# Altium footprint library IC_updated.PcbLib: 64 footprints (part 1 of 4)
Each footprint in its own frame and in the unit in brackets; x right, y up, seen from the top. Pads: shape width x height; smd on the part's side, far side on the other; paste and mask are expansions set on the pad; w line width, h text height; cw(c..) or ccw(c..) is an arc to the next point about the centre after c.
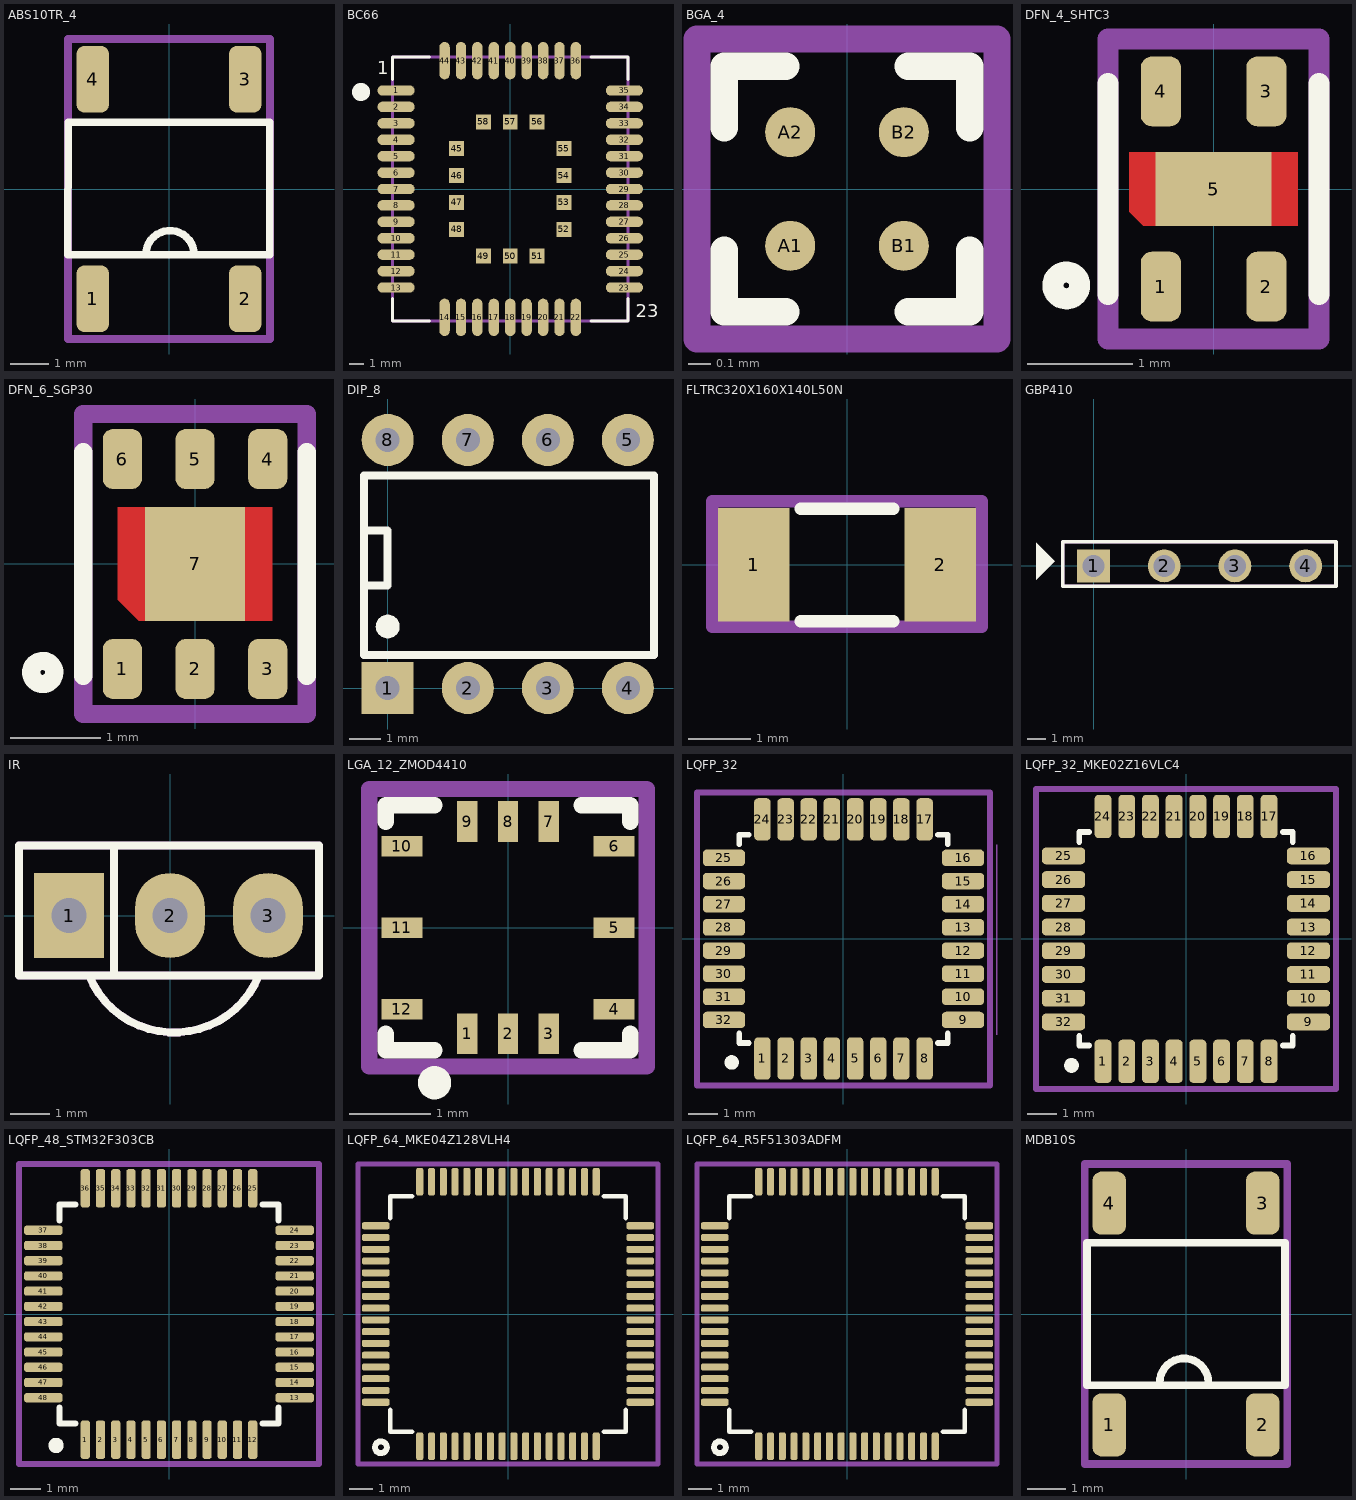
[diagram p0: the footprints below, top view; thin cyan lines are the x and y axes]

## ABS10TR_4 [mm] "Small Outline IC (SOIC), 4.00 mm pitch; 4 pin, 5.05 mm L X 4.40 mm W X 1.50 mm H body"
height 1.5
pads (4):
  rrect49% 0.85x1.75 smd: 1(-2,-2.88) 2(2,-2.88) 3(2,2.88) 4(-2,2.88)
Top Overlay:
  lines w0.2: -0.61,-1.727 cw(c0.025,-1.727) 0.66,-1.727 ; -2.655,-1.727 -2.647,1.756 2.642,1.756 2.642,-1.727 -2.655,-1.727
Mechanical 13:
  lines w0.2: -2.65,-3.937 -2.65,3.937 2.65,3.937 2.65,-3.937 -2.65,-3.937
  text ".Designator" at -2.388,-0.203 h1.5
3D body "DB.STEP": height 1.5, standoff 0, extent -2.525,-3.2 2.525,3.2

## BC66 [mm]
pads (58):
  oval 2.5x0.7 smd: 1(-7.65,6.6) 2(-7.65,5.5) 3(-7.65,4.4) 4(-7.65,3.3) 5(-7.65,2.2) 6(-7.65,1.1) 7(-7.65,0) 8(-7.65,-1.1) 9(-7.65,-2.2) 10(-7.65,-3.3) 11(-7.65,-4.4) 12(-7.65,-5.5) 13(-7.65,-6.6) 23(7.65,-6.6) 24(7.65,-5.5) 25(7.65,-4.4) 26(7.65,-3.3) 27(7.65,-2.2) 28(7.65,-1.1) 29(7.65,0) 30(7.65,1.1) 31(7.65,2.2) 32(7.65,3.3) 33(7.65,4.4) 34(7.65,5.5) 35(7.65,6.6)
  oval 0.7x2.5 smd: 14(-4.4,-8.6) 15(-3.3,-8.6) 16(-2.2,-8.6) 17(-1.1,-8.6) 18(0,-8.6) 19(1.1,-8.6) 20(2.2,-8.6) 21(3.3,-8.6) 22(4.4,-8.6) 36(4.4,8.6) 37(3.3,8.6) 38(2.2,8.6) 39(1.1,8.6) 40(0,8.6) 41(-1.1,8.6) 42(-2.2,8.6) 43(-3.3,8.6) 44(-4.4,8.6)
  rect 1x1 smd: 45(-3.6,2.7) 46(-3.6,0.9) 47(-3.6,-0.9) 48(-3.6,-2.7) 49(-1.8,-4.5) 50(0,-4.5) 51(1.8,-4.5) 52(3.6,-2.7) 53(3.6,-0.9) 54(3.6,0.9) 55(3.6,2.7) 56(1.8,4.5) 57(0,4.5) 58(-1.8,4.5)
Top Overlay:
  circle w0.8: c-10,6.5 r0.2
  lines w0.2: -7.9,-8.85 -5.4,-8.85 ; -7.9,-8.85 -7.9,-7.35 ; -7.9,7.35 -7.9,8.85 -5.4,8.85 ; 5.4,-8.85 7.9,-8.85 ; 5.4,8.85 7.9,8.85 7.9,7.35 ; 7.9,-8.85 7.9,-7.35
  text "1" at -8.9,7.4 h1.5
  text "23" at 8.4,-8.9 h1.5
Mechanical 13:
  lines w0.2: -7.9,-8.85 7.9,-8.85 7.9,8.85 -7.9,8.85 -7.9,-8.85
  text ".Designator" at -2.1,-0.8 h1.5
3D body: height 2, standoff 0, extent -7.874,-8.839 7.874,8.839

## BGA_4 [mm] "Ball Grid Array (BGA), 0.50 mm pitch, square; 4 pin, 0.888 mm L X 0.888 mm W X 0.50 mm H body"
height 0.5
pads (4):
  round 0.22 smd: A1(-0.25,-0.25) A2(-0.25,0.25) B1(0.25,-0.25) B2(0.25,0.25)
Top Overlay:
  lines w0.12: -0.54,-0.27 -0.54,-0.54 -0.27,-0.54 ; -0.54,0.27 -0.54,0.54 -0.27,0.54 ; 0.27,-0.54 0.54,-0.54 0.54,-0.27 ; 0.27,0.54 0.54,0.54 0.54,0.27
Mechanical 13:
  lines w0.12: -0.66,-0.66 0.66,-0.66 0.66,0.66 -0.66,0.66 -0.66,-0.66
  text ".Designator" at -0.737,-0.203 h1
3D body "BGA4CP50_2X2_88X88X50B22.STEP": height 0.5, standoff 0, extent -0.444,-0.444 0.444,0.444

## DFN_4_SHTC3 [mm] "Small Outline No-Lead (SON with Tab), 1.00 mm pitch; 4 pin, 2.00 mm L X 2.00 mm W X 0.75 mm H body"
height 0.75
pads (5):
  rrect53% 0.38x0.66 smd: 1(-0.5,-0.925) 2(0.5,-0.925) 3(0.5,0.925) 4(-0.5,0.925)
  rect 1.1x0.7 smd paste-1.1 mask-1.1: 5(0,0)
Top Layer:
  region: 0.8,-0.35 -0.666,-0.35 -0.8,-0.216 -0.8,0.35 0.8,0.35
Top Overlay:
  lines w0.2: -1.271,-0.897 ccw(c-1.397,-0.914) -1.27,-0.914 ; -1,-1 -1,1 ; 1,-1 1,1
Top Paste:
  region: 0.8,-0.35 -0.55,-0.35 -0.8,-0.1 -0.8,0.35 0.8,0.35
Top Solder:
  region: 0.8,-0.35 -0.55,-0.35 -0.8,-0.1 -0.8,0.35 0.8,0.35
Mechanical 13:
  lines w0.2: -1,-1.422 -1,1.422 1,1.422 1,-1.422 -1,-1.422
  text ".Designator" at -0.813,-0.254 h1
3D body "SON5P100_200X200X75L35X35T160X70.STEP": height 0.75, standoff 0, extent -1,-1.05 1,1.05

## DFN_6_SGP30 [mm] "Small Outline No-Lead (SON with Tab), 0.80 mm pitch; 6 pin, 2.45 mm L X 2.45 mm W X 0.90 mm H body"
height 0.9
pads (7):
  rrect51% 0.43x0.66 smd: 1(-0.8,-1.155) 2(0,-1.155) 3(0.8,-1.155) 4(0.8,1.155) 5(0,1.155) 6(-0.8,1.155)
  rect 1.1x1.25 smd paste-1.25 mask-1.25: 7(0,0)
Top Layer:
  region: 0.85,-0.625 -0.62,-0.625 -0.85,-0.395 -0.85,0.625 0.85,0.625
Top Overlay:
  lines w0.2: -1.551,-1.177 ccw(c-1.676,-1.194) -1.549,-1.194 ; -1.23,-1.23 -1.23,1.23 ; 1.23,-1.23 1.23,1.23
Top Paste:
  region: -0.09,-0.431 -0.744,-0.431 -0.744,0.44 -0.09,0.44
  region: 0.76,-0.44 0.09,-0.44 0.09,0.44 0.76,0.44
Top Solder:
  region: 0.85,-0.625 -0.55,-0.625 -0.85,-0.325 -0.85,0.625 0.85,0.625
Mechanical 13:
  lines w0.2: -1.23,-1.651 1.23,-1.651 1.23,1.651 -1.23,1.651 -1.23,-1.651
  text ".Designator" at -1.041,-0.356 h1
3D body "SON7P80_245X245X90L35X40T170X125.STEP": height 0.9, standoff 0, extent -1.225,-1.275 1.225,1.275

## DIP_8 [mm] "DIP, 7.62 mm lead span, 2.54 mm pitch; 8 pin, 10.92 mm L X 6.60 mm W X 3.32 mm H body"
height 3.32
pads (9):
  rect 1.65x1.65 hole 0.762 mask+0.102: 1(0,0)
  round 1.65 hole 0.762 mask+0.102: 2(2.54,0) 3(5.08,0) 4(7.62,0) 5(7.62,7.87) 6(5.08,7.87) 7(2.54,7.87) 8(0,7.87)
  round 0.762 on Top Overlay mask+0.102: ""(0,1.95)
Top Overlay:
  lines w0.254: -0.75,3.25 0,3.25 0,5 -0.7,5 ; -0.75,1.05 8.45,1.05 8.45,6.75 -0.75,6.75 -0.75,1.05
Mechanical 13:
  lines w0.2: -0.762,1.067 8.458,1.041 8.433,6.756 -0.737,6.731 -0.762,1.067
  text ".Designator" at 0.813,3.861 h1.5
3D body "DIP762W45P254L1092H332Q8.STEP": height 3.32, standoff -2, extent -1.65,0.051 9.27,7.925

## FLTRC320X160X140L50N [mm]
pads (2):
  rect 1.14x1.82 smd: 1(-1.49,0) 2(1.49,0)
Top Overlay:
  lines w0.2: -0.74,-0.9 0.74,-0.9 ; -0.74,0.9 0.74,0.9
Mechanical 13:
  lines w0.127: -2.159,-0.991 -2.159,1.016 2.159,1.016 2.159,-0.991 -2.159,-0.991
  lines w0.2: -2.159,-0.991 2.159,-0.991 2.159,1.016 -2.159,1.016 -2.159,-0.991
  text ".Designator" at -1.88,-0.254 h1
3D body "FLTRC320X160X140L50.STEP": height 1.4, standoff 0, extent -1.6,-0.8 1.6,0.8

## GBP410 [mm] "SIP, 3.81 mm pitch; 4 pin, 14.70 mm L X 2.20 mm W X 12.50 mm H body"
height 12.5
pads (4):
  rect 1.77x1.77 / inner round 1.77 / far side rect 1.77x1.77 hole 1.18 paste-1.77: 1(0,0)
  round 1.77 hole 1.18 paste-1.77: 2(3.81,0) 3(7.62,0) 4(11.43,0)
Top Overlay:
  region: -3.099,-0.746 -2.099,0.254 -3.099,1.254
  lines w0.2: -1.651,-1.092 13.065,-1.092 13.065,1.3 -1.651,1.3 -1.651,-1.092
Mechanical 13:
  lines w0.2: -1.651,-1.092 -1.651,1.295 13.056,1.295 13.056,-1.092 -1.651,-1.092
  text ".Designator" at 2.007,-0.254 h1.5
3D body "SIP220W74P381L1470H1250Q4.STEP": height 12.5, standoff -2, extent -1.635,-0.9 13.065,1.3

## IR [mil]
pads (3):
  rect 70x85 hole 35: 1(-101,0)
  oval 70x85 hole 35: 2(0,0) 3(98,0)
Top Overlay:
  lines w7.87: -81,-60 ccw(c4,-25) 89,-60 ; -56,-60 -56,70 ; -151,-60 149,-60 149,70 -151,70 -151,-60
Mechanical 13:
  lines w7.87: -81,-60 ccw(c4,-25) 89,-60 ; -56,-60 -56,70 ; -151,-60 -151,70 149,70 149,-60 -151,-60
  text ".Designator" at -140,-15 h39.37
3D body "SW3dPS-TO92.STEP": height 245.04, standoff -199.79, extent -108.87,-99.53 108.87,61.03

## LGA_12_ZMOD4410 [mm]
pads (12):
  rect 0.25x0.5 smd: 1(-0.5,-1.3) 2(0,-1.3) 3(0.5,-1.3) 7(0.5,1.3) 8(0,1.3) 9(-0.5,1.3)
  rect 0.5x0.25 smd: 4(1.3,-1) 5(1.3,0) 6(1.3,1) 10(-1.3,1) 11(-1.3,0) 12(-1.3,-1)
Top Overlay:
  circle w0.254: c-0.9,-1.9 r0.076
  lines w0.2: -1.5,-1.3 -1.5,-1.5 -0.9,-1.5 ; -1.5,1.3 -1.5,1.5 -0.9,1.5 ; 0.9,-1.5 1.5,-1.5 1.5,-1.3 ; 0.9,1.5 1.5,1.5 1.5,1.3
Mechanical 13:
  lines w0.2: -1.7,-1.7 1.7,-1.7 1.7,1.7 -1.7,1.7 -1.7,-1.7
  text ".Designator" at -1.168,-0.406 h1
3D body: height 0.77, standoff 0, extent -1.5,-1.5 1.5,1.5

## LQFP_32 [mm] "Quad Flat Pack (QFP), 0.80 mm pitch; square, 8 pin X 8 pin, 7.00 mm L X 7.00 mm W X 1.60 mm H body"
height 1.6
pads (32):
  rrect49% 0.57x1.46 smd: 1(-2.8,-4.13) 2(-2,-4.13) 3(-1.2,-4.13) 4(-0.4,-4.13) 5(0.4,-4.13) 6(1.2,-4.13) 7(2,-4.13) 8(2.8,-4.13) 17(2.8,4.13) 18(2,4.13) 19(1.2,4.13) 20(0.4,4.13) 21(-0.4,4.13) 22(-1.2,4.13) 23(-2,4.13) 24(-2.8,4.13)
  rrect49% 1.46x0.57 smd: 9(4.13,-2.8) 10(4.13,-2) 11(4.13,-1.2) 12(4.13,-0.4) 13(4.13,0.4) 14(4.13,1.2) 15(4.13,2) 16(4.13,2.8) 25(-4.13,2.8) 26(-4.13,2) 27(-4.13,1.2) 28(-4.13,0.4) 29(-4.13,-0.4) 30(-4.13,-1.2) 31(-4.13,-2) 32(-4.13,-2.8)
Top Overlay:
  circle w0.25: c-3.861,-4.267 r0.125
  lines w0.2: -3.6,-3.27 -3.6,-3.6 -3.27,-3.6 ; -3.6,3.27 -3.6,3.6 -3.27,3.6 ; 3.27,-3.6 3.6,-3.6 3.6,-3.27 ; 3.27,3.6 3.6,3.6 3.6,3.27
Mechanical 13:
  lines w0.2: -5.06,-5.06 5.06,-5.06 5.06,5.055 -5.06,5.055 -5.06,-5.06
  text ".Designator" at -3.023,-0.178 h1.5
Mechanical 15:
  lines w0.05: 5.303,-3.31 5.303,3.26
3D body "QFP32P80_900X900X160L60X37.STEP": height 1.6, standoff 0, extent -4.5,-4.5 4.5,4.5

## LQFP_32_MKE02Z16VLC4 [mm] "Quad Flat Pack (QFP), 0.80 mm pitch; square, 8 pin X 8 pin, 7.00 mm L X 7.00 mm W X 1.60 mm H body"
height 1.6
pads (32):
  rrect49% 0.57x1.46 smd: 1(-2.8,-4.13) 2(-2,-4.13) 3(-1.2,-4.13) 4(-0.4,-4.13) 5(0.4,-4.13) 6(1.2,-4.13) 7(2,-4.13) 8(2.8,-4.13) 17(2.8,4.13) 18(2,4.13) 19(1.2,4.13) 20(0.4,4.13) 21(-0.4,4.13) 22(-1.2,4.13) 23(-2,4.13) 24(-2.8,4.13)
  rrect49% 1.46x0.57 smd: 9(4.13,-2.8) 10(4.13,-2) 11(4.13,-1.2) 12(4.13,-0.4) 13(4.13,0.4) 14(4.13,1.2) 15(4.13,2) 16(4.13,2.8) 25(-4.13,2.8) 26(-4.13,2) 27(-4.13,1.2) 28(-4.13,0.4) 29(-4.13,-0.4) 30(-4.13,-1.2) 31(-4.13,-2) 32(-4.13,-2.8)
Top Overlay:
  circle w0.25: c-3.861,-4.267 r0.125
  lines w0.2: -3.6,-3.27 -3.6,-3.6 -3.27,-3.6 ; -3.6,3.27 -3.6,3.6 -3.27,3.6 ; 3.27,-3.6 3.6,-3.6 3.6,-3.27 ; 3.27,3.6 3.6,3.6 3.6,3.27
Mechanical 13:
  lines w0.2: -5.06,-5.06 -5.06,5.055 5.06,5.055 5.06,-5.06 -5.06,-5.06
  text ".Designator" at -3.023,-0.178 h1.5
3D body "QFP32P80_900X900X160L60X37.STEP": height 1.6, standoff 0, extent -4.5,-4.5 4.5,4.5

## LQFP_48_STM32F303CB [mm] "Quad Flat Pack (QFP), 0.50 mm pitch; square, 12 pin X 12 pin, 7.00 mm L X 7.00 mm W X 1.60 mm H body"
height 1.6
pads (48):
  rrect53% 0.3x1.26 smd: 1(-2.75,-4.13) 2(-2.25,-4.13) 3(-1.75,-4.13) 4(-1.25,-4.13) 5(-0.75,-4.13) 6(-0.25,-4.13) 7(0.25,-4.13) 8(0.75,-4.13) 9(1.25,-4.13) 10(1.75,-4.13) 11(2.25,-4.13) 12(2.75,-4.13) 25(2.75,4.13) 26(2.25,4.13) 27(1.75,4.13) 28(1.25,4.13) 29(0.75,4.13) 30(0.25,4.13) 31(-0.25,4.13) 32(-0.75,4.13) 33(-1.25,4.13) 34(-1.75,4.13) 35(-2.25,4.13) 36(-2.75,4.13)
  rrect53% 1.26x0.3 smd: 13(4.13,-2.75) 14(4.13,-2.25) 15(4.13,-1.75) 16(4.13,-1.25) 17(4.13,-0.75) 18(4.13,-0.25) 19(4.13,0.25) 20(4.13,0.75) 21(4.13,1.25) 22(4.13,1.75) 23(4.13,2.25) 24(4.13,2.75) 37(-4.13,2.75) 38(-4.13,2.25) 39(-4.13,1.75) 40(-4.13,1.25) 41(-4.13,0.75) 42(-4.13,0.25) 43(-4.13,-0.25) 44(-4.13,-0.75) 45(-4.13,-1.25) 46(-4.13,-1.75) 47(-4.13,-2.25) 48(-4.13,-2.75)
Top Overlay:
  circle w0.25: c-3.708,-4.318 r0.125
  lines w0.2: -3.6,-3.08 -3.6,-3.6 -3.08,-3.6 ; -3.6,3.08 -3.6,3.6 -3.08,3.6 ; 3.08,-3.6 3.6,-3.6 3.6,-3.08 ; 3.08,3.6 3.6,3.6 3.6,3.08
Mechanical 13:
  lines w0.2: -4.928,-4.928 -4.928,4.928 4.928,4.928 4.928,-4.928 -4.928,-4.928
  text ".Designator" at -3.124,-0.152 h1.5
3D body "QFP48P50_900X900X160L60X22.STEP": height 1.6, standoff 0, extent -4.5,-4.5 4.5,4.5

## LQFP_64_MKE04Z128VLH4 [mm] "Quad Flat Pack (QFP), 0.50 mm pitch; square, 16 pin X 16 pin, 10.00 mm L X 10.00 mm W X 1.45 mm H body"
height 1.45
pads (64):
  rrect53% 0.3x1.17 smd: 1(-3.75,-5.62) 2(-3.25,-5.62) 3(-2.75,-5.62) 4(-2.25,-5.62) 5(-1.75,-5.62) 6(-1.25,-5.62) 7(-0.75,-5.62) 8(-0.25,-5.62) 9(0.25,-5.62) 10(0.75,-5.62) 11(1.25,-5.62) 12(1.75,-5.62) 13(2.25,-5.62) 14(2.75,-5.62) 15(3.25,-5.62) 16(3.75,-5.62) 33(3.75,5.62) 34(3.25,5.62) 35(2.75,5.62) 36(2.25,5.62) 37(1.75,5.62) 38(1.25,5.62) 39(0.75,5.62) 40(0.25,5.62) 41(-0.25,5.62) 42(-0.75,5.62) 43(-1.25,5.62) 44(-1.75,5.62) 45(-2.25,5.62) 46(-2.75,5.62) 47(-3.25,5.62) 48(-3.75,5.62)
  rrect53% 1.17x0.3 smd: 17(5.62,-3.75) 18(5.62,-3.25) 19(5.62,-2.75) 20(5.62,-2.25) 21(5.62,-1.75) 22(5.62,-1.25) 23(5.62,-0.75) 24(5.62,-0.25) 25(5.62,0.25) 26(5.62,0.75) 27(5.62,1.25) 28(5.62,1.75) 29(5.62,2.25) 30(5.62,2.75) 31(5.62,3.25) 32(5.62,3.75) 49(-5.62,3.75) 50(-5.62,3.25) 51(-5.62,2.75) 52(-5.62,2.25) 53(-5.62,1.75) 54(-5.62,1.25) 55(-5.62,0.75) 56(-5.62,0.25) 57(-5.62,-0.25) 58(-5.62,-0.75) 59(-5.62,-1.25) 60(-5.62,-1.75) 61(-5.62,-2.25) 62(-5.62,-2.75) 63(-5.62,-3.25) 64(-5.62,-3.75)
Top Overlay:
  circle w0.254: c-5.4,-5.664 r0.25
  lines w0.2: -5,-4.08 -5,-5 -4.08,-5 ; -5,4.08 -5,5 -4.08,5 ; 4.08,-5 5,-5 5,-4.08 ; 4.08,5 5,5 5,4.08
Mechanical 13:
  lines w0.2: -6.375,-6.375 -6.375,6.375 6.375,6.375 6.375,-6.375 -6.375,-6.375
  text ".Designator" at -4.318,0.102 h1.5
3D body "QFP64P50_1200X1200X145L60X22.STEP": height 1.45, standoff 0, extent -6,-6 6,6

## LQFP_64_R5F51303ADFM [mm] "Quad Flat Pack (QFP), 0.50 mm pitch; square, 16 pin X 16 pin, 10.00 mm L X 10.00 mm W X 1.70 mm H body"
height 1.7
pads (64):
  rrect53% 0.3x1.17 smd: 1(-3.75,-5.62) 2(-3.25,-5.62) 3(-2.75,-5.62) 4(-2.25,-5.62) 5(-1.75,-5.62) 6(-1.25,-5.62) 7(-0.75,-5.62) 8(-0.25,-5.62) 9(0.25,-5.62) 10(0.75,-5.62) 11(1.25,-5.62) 12(1.75,-5.62) 13(2.25,-5.62) 14(2.75,-5.62) 15(3.25,-5.62) 16(3.75,-5.62) 33(3.75,5.62) 34(3.25,5.62) 35(2.75,5.62) 36(2.25,5.62) 37(1.75,5.62) 38(1.25,5.62) 39(0.75,5.62) 40(0.25,5.62) 41(-0.25,5.62) 42(-0.75,5.62) 43(-1.25,5.62) 44(-1.75,5.62) 45(-2.25,5.62) 46(-2.75,5.62) 47(-3.25,5.62) 48(-3.75,5.62)
  rrect53% 1.17x0.3 smd: 17(5.62,-3.75) 18(5.62,-3.25) 19(5.62,-2.75) 20(5.62,-2.25) 21(5.62,-1.75) 22(5.62,-1.25) 23(5.62,-0.75) 24(5.62,-0.25) 25(5.62,0.25) 26(5.62,0.75) 27(5.62,1.25) 28(5.62,1.75) 29(5.62,2.25) 30(5.62,2.75) 31(5.62,3.25) 32(5.62,3.75) 49(-5.62,3.75) 50(-5.62,3.25) 51(-5.62,2.75) 52(-5.62,2.25) 53(-5.62,1.75) 54(-5.62,1.25) 55(-5.62,0.75) 56(-5.62,0.25) 57(-5.62,-0.25) 58(-5.62,-0.75) 59(-5.62,-1.25) 60(-5.62,-1.75) 61(-5.62,-2.25) 62(-5.62,-2.75) 63(-5.62,-3.25) 64(-5.62,-3.75)
Top Overlay:
  circle w0.254: c-5.4,-5.664 r0.25
  lines w0.2: -5,-4.08 -5,-5 -4.08,-5 ; -5,4.08 -5,5 -4.08,5 ; 4.08,-5 5,-5 5,-4.08 ; 4.08,5 5,5 5,4.08
Mechanical 13:
  lines w0.2: -6.375,-6.375 -6.375,6.375 6.375,6.375 6.375,-6.375 -6.375,-6.375
  text ".Designator" at -4.318,0.102 h1.5
3D body "QFP64P50_1200X1200X145L60X22.STEP": height 1.45, standoff 0, extent -6,-6 6,6

## MDB10S [mm] "Small Outline IC (SOIC), 4.00 mm pitch; 4 pin, 5.00 mm L X 4.40 mm W X 1.45 mm H body"
height 1.45
pads (4):
  rrect51% 0.87x1.64 smd: 1(-2,-2.89) 2(2,-2.89) 3(2,2.89) 4(-2,2.89)
Top Overlay:
  lines w0.2: -0.686,-1.793 cw(c-0.051,-1.793) 0.584,-1.793 ; -2.58,-1.854 2.58,-1.854 2.58,1.854 -2.58,1.854 -2.58,-1.854
Mechanical 13:
  lines w0.2: -2.635,-3.91 -2.635,-2.48 -2.635,2.48 -2.635,3.91 2.635,3.91 2.635,2.48 2.635,-2.48 2.635,-3.91 -2.635,-3.91
  text ".Designator" at -2.337,-0.457 h1.5
3D body "SOIC4P400_500X650X145L60X65.STEP": height 1.45, standoff 0, extent -2.5,-3.25 2.5,3.25